# Altium integrated library TI Power Management Battery Management.IntLib: 950 symbols (part 5 of 48)
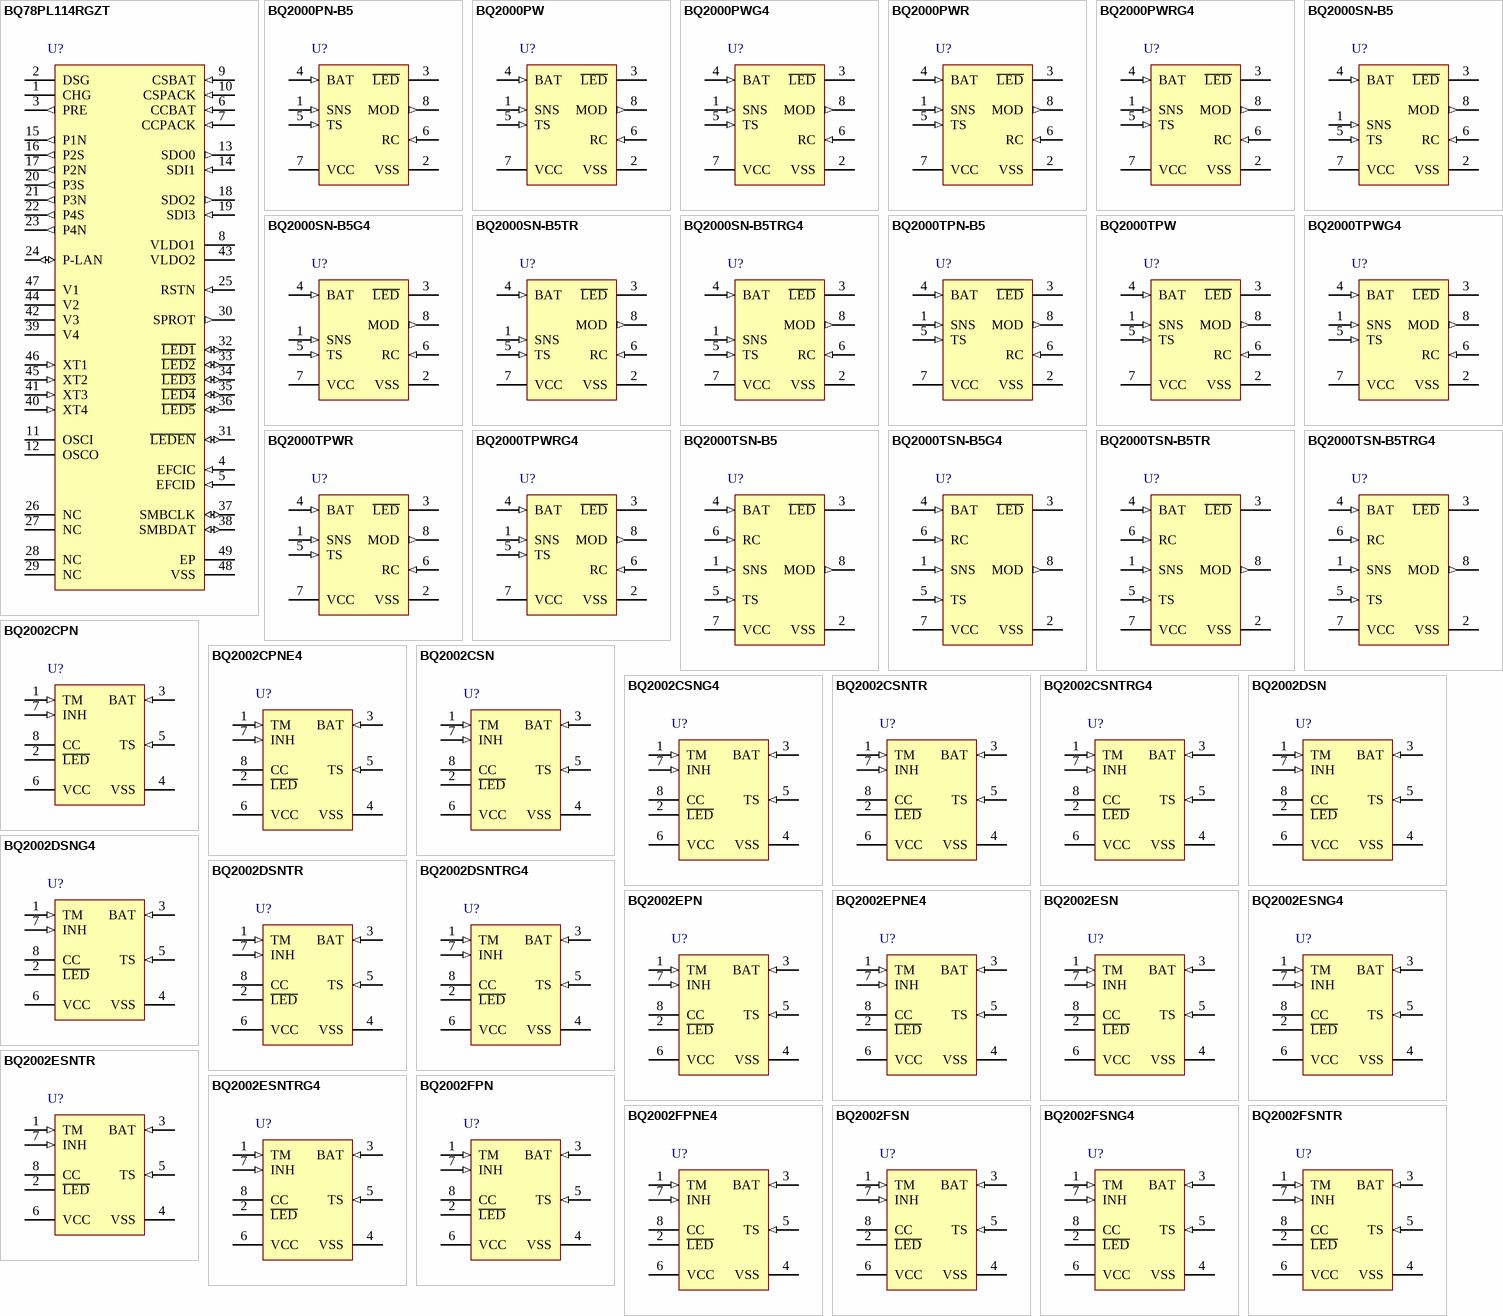
[diagram p38: symbols BQ78PL114RGZT to BQ2002FSNTR]

## BQ2000PWRG4
designator U?
Switch-Mode Multi-Chemistry Battery Charger with Peak Voltage Detection Termination, 4 V, -20 to 70 degC, 8-pin TSSOP (PW), Green (RoHS & no Sb/Br); PartNumber: BQ2000PWRG4; Manufacturer: Texas Instruments; Lead Acid: N; Li-Ion: Y; SubFamily: Battery Charge Management; Vin(Min)(V): 4; DatasheetVersion: SLUS138D; PackageVersion: revG, Feb-2011; PackageReference: PW8; PackageDescription: 8-Pin Plastic Thin Small Outline Package 3 x 4.4 mm Body ,0.65 mm Pitch; Supplier 1: Digi-Key; Supplier Part Number 1: BQ2000PWRG4-ND; Supplier Part Number 3: 595-BQ2000PWRG4; Eco-Plan: Green (RoHS & no Sb/Br); Li-Polymer: Y; NiCd: Y; NiMH: Y; Over Voltage Protection: N; Mounting Technology: Surface Mount; Code_JEDEC: MO-153; ComponentLink1Description: Datasheet; ComponentLink1URL: http://www.ti.com/general/docs/lit/getliterature.tsp?genericPartNumber=BQ2000&fileType=pdf
footprint PW8_N (TSOP, 8-Leads, Body 3x4.4mm, Pitch 0.65mm, IPC Medium Density)
footprint PW8_L (TSOP, 8-Leads, Body 3x4.4mm, Pitch 0.65mm, IPC High Density)
footprint PW8_M (TSOP, 8-Leads, Body 3x4.4mm, Pitch 0.65mm, IPC Low Density)
pins: 1 SNS (in) "Current-sense input. Enables the bq2000 to sense the battery current via the voltage developed on this pin by an external sense-resistor connected in series with the battery pack", 2 VSS (power) "System ground. Connect to the battery’s negative terminal", 3 ~{LED} (hiz) "Charge-status output. Open-drain output that indicates the charging status by turning on, turning off, or flashing an external LED, driven through a resistor.", 4 BAT (in) "Battery-voltage input. Battery-voltage sense input. A simple resistive divider, across the battery terminals, generates this input.", 5 TS (in) "Temperature-sense input. Input for an external battery-temperature monitoring circuit. An external resistive divider network with a negative temperature-coefficient thermistor sets the lower and upper temperature thresholds.", 6 RC (in) "Timer-program input. Used to program the maximum fast charge-time, maximum top-off charge-time, hold-off period, trickle charge rate, and to disable or enable top-off charge. A capacitor from VCC and a resistor to ground (See Datasheet)", 7 VCC (power) "Supply-voltage input. Recommended bypassing is 10 uF + 0.1 uF to 0.22 uF of decoupling capacitance near the pin.", 8 MOD (out) "Modulation-control output. Push-pull output that controls the charging current to the battery. MOD switches high to enable charging current to flow and low to inhibit charging-current flow."

## BQ2000SN-B5
designator U?
Switch-Mode Multi-Chemistry Battery Charger with Peak Voltage Detection Termination, 4 V, -20 to 70 degC, 8-pin SOIC (D), Green (RoHS & no Sb/Br); PartNumber: BQ2000SN-B5; Manufacturer: Texas Instruments; Lead Acid: N; Li-Ion: Y; SubFamily: Battery Charge Management; Vin(Min)(V): 4; DatasheetVersion: SLUS138D; PackageVersion: revM, Jun-2011; PackageReference: D8; PackageDescription: 8-Pin Plastic Small Outline Integrated Circuit, 4.9 x 3.9 mm, Pitch 1.27 mm Pitch; Supplier 1: Digi-Key; Supplier Part Number 1: 296-9314-5-ND; Supplier Part Number 3: 06M5840; Eco-Plan: Green (RoHS & no Sb/Br); Li-Polymer: Y; NiCd: Y; NiMH: Y; Over Voltage Protection: N; Mounting Technology: Surface Mount; Code_JEDEC: MS-012AA; ComponentLink1Description: Datasheet; ComponentLink1URL: http://www.ti.com/general/docs/lit/getliterature.tsp?genericPartNumber=BQ2000&fileType=pdf
footprint D8_N (SOIC, 8-Leads, Body 4.9x3.9mm, Pitch 1.27mm, IPC Medium Density)
footprint D8_L (SOIC, 8-Leads, Body 4.9x3.9mm, Pitch 1.27mm, IPC High Density)
footprint D8_M (SOIC, 8-Leads, Body 4.9x3.9mm, Pitch 1.27mm, IPC Low Density)
pins: 1 SNS (in) "Current-sense input. Enables the bq2000 to sense the battery current via the voltage developed on this pin by an external sense-resistor connected in series with the battery pack", 2 VSS (power) "System ground. Connect to the battery's negative terminal", 3 ~{LED} (hiz) "Charge-status output. Open-drain output that indicates the charging status by turning on, turning off, or flashing an external LED, driven through a resistor.", 4 BAT (in) "Battery-voltage input. Battery-voltage sense input. A simple resistive divider, across the battery terminals, generates this input.", 5 TS (in) "Temperature-sense input. Input for an external battery-temperature monitoring circuit. An external resistive divider network with a negative temperature-coefficient thermistor sets the lower and upper temperature thresholds.", 6 RC (in) "Timer-program input. Used to program the maximum fast charge-time, maximum top-off charge-time, hold-off period, trickle charge rate, and to disable or enable top-off charge. A capacitor from VCC and a resistor to ground (See Datasheet)", 7 VCC (power) "Supply-voltage input. Recommended bypassing is 10 uF + 0.1 uF to 0.22 uF of decoupling capacitance near the pin.", 8 MOD (out) "Modulation-control output. Push-pull output that controls the charging current to the battery. MOD switches high to enable charging current to flow and low to inhibit charging-current flow."

## BQ2000SN-B5G4
designator U?
Switch-Mode Multi-Chemistry Battery Charger with Peak Voltage Detection Termination, 4 V, -20 to 70 degC, 8-pin SOIC (D), Green (RoHS & no Sb/Br); PartNumber: BQ2000SN-B5G4; Manufacturer: Texas Instruments; Lead Acid: N; Li-Ion: Y; SubFamily: Battery Charge Management; Vin(Min)(V): 4; DatasheetVersion: SLUS138D; PackageVersion: revM, Jun-2011; PackageReference: D8; PackageDescription: 8-Pin Plastic Small Outline Integrated Circuit, 4.9 x 3.9 mm, Pitch 1.27 mm Pitch; Supplier 1: Digi-Key; Supplier Part Number 1: BQ2000SN-B5G4-ND; Supplier Part Number 3: 595-BQ2000SN-B5G4; Eco-Plan: Green (RoHS & no Sb/Br); Li-Polymer: Y; NiCd: Y; NiMH: Y; Over Voltage Protection: N; Mounting Technology: Surface Mount; Code_JEDEC: MS-012AA; ComponentLink1Description: Datasheet; ComponentLink1URL: http://www.ti.com/general/docs/lit/getliterature.tsp?genericPartNumber=BQ2000&fileType=pdf
footprint D8_N (SOIC, 8-Leads, Body 4.9x3.9mm, Pitch 1.27mm, IPC Medium Density)
footprint D8_L (SOIC, 8-Leads, Body 4.9x3.9mm, Pitch 1.27mm, IPC High Density)
footprint D8_M (SOIC, 8-Leads, Body 4.9x3.9mm, Pitch 1.27mm, IPC Low Density)
pins: 1 SNS (in) "Current-sense input. Enables the bq2000 to sense the battery current via the voltage developed on this pin by an external sense-resistor connected in series with the battery pack", 2 VSS (power) "System ground. Connect to the battery's negative terminal", 3 ~{LED} (hiz) "Charge-status output. Open-drain output that indicates the charging status by turning on, turning off, or flashing an external LED, driven through a resistor.", 4 BAT (in) "Battery-voltage input. Battery-voltage sense input. A simple resistive divider, across the battery terminals, generates this input.", 5 TS (in) "Temperature-sense input. Input for an external battery-temperature monitoring circuit. An external resistive divider network with a negative temperature-coefficient thermistor sets the lower and upper temperature thresholds.", 6 RC (in) "Timer-program input. Used to program the maximum fast charge-time, maximum top-off charge-time, hold-off period, trickle charge rate, and to disable or enable top-off charge. A capacitor from VCC and a resistor to ground (See Datasheet)", 7 VCC (power) "Supply-voltage input. Recommended bypassing is 10 uF + 0.1 uF to 0.22 uF of decoupling capacitance near the pin.", 8 MOD (out) "Modulation-control output. Push-pull output that controls the charging current to the battery. MOD switches high to enable charging current to flow and low to inhibit charging-current flow."

## BQ2000SN-B5TR
designator U?
Switch-Mode Multi-Chemistry Battery Charger with Peak Voltage Detection Termination, 4 V, -20 to 70 degC, 8-pin SOIC (D), Green (RoHS & no Sb/Br); PartNumber: BQ2000SN-B5TR; Manufacturer: Texas Instruments; Lead Acid: N; Li-Ion: Y; SubFamily: Battery Charge Management; Vin(Min)(V): 4; DatasheetVersion: SLUS138D; PackageVersion: revM, Jun-2011; PackageReference: D8; PackageDescription: 8-Pin Plastic Small Outline Integrated Circuit, 4.9 x 3.9 mm, Pitch 1.27 mm Pitch; Supplier 1: Digi-Key; Supplier Part Number 1: 296-25915-2-ND; Supplier Part Number 3: 296-25915-6-ND; Eco-Plan: Green (RoHS & no Sb/Br); Li-Polymer: Y; NiCd: Y; NiMH: Y; Over Voltage Protection: N; Mounting Technology: Surface Mount; Code_JEDEC: MS-012AA; ComponentLink1Description: Datasheet; ComponentLink1URL: http://www.ti.com/general/docs/lit/getliterature.tsp?genericPartNumber=BQ2000&fileType=pdf
footprint D8_N (SOIC, 8-Leads, Body 4.9x3.9mm, Pitch 1.27mm, IPC Medium Density)
footprint D8_L (SOIC, 8-Leads, Body 4.9x3.9mm, Pitch 1.27mm, IPC High Density)
footprint D8_M (SOIC, 8-Leads, Body 4.9x3.9mm, Pitch 1.27mm, IPC Low Density)
pins: 1 SNS (in) "Current-sense input. Enables the bq2000 to sense the battery current via the voltage developed on this pin by an external sense-resistor connected in series with the battery pack", 2 VSS (power) "System ground. Connect to the battery's negative terminal", 3 ~{LED} (hiz) "Charge-status output. Open-drain output that indicates the charging status by turning on, turning off, or flashing an external LED, driven through a resistor.", 4 BAT (in) "Battery-voltage input. Battery-voltage sense input. A simple resistive divider, across the battery terminals, generates this input.", 5 TS (in) "Temperature-sense input. Input for an external battery-temperature monitoring circuit. An external resistive divider network with a negative temperature-coefficient thermistor sets the lower and upper temperature thresholds.", 6 RC (in) "Timer-program input. Used to program the maximum fast charge-time, maximum top-off charge-time, hold-off period, trickle charge rate, and to disable or enable top-off charge. A capacitor from VCC and a resistor to ground (See Datasheet)", 7 VCC (power) "Supply-voltage input. Recommended bypassing is 10 uF + 0.1 uF to 0.22 uF of decoupling capacitance near the pin.", 8 MOD (out) "Modulation-control output. Push-pull output that controls the charging current to the battery. MOD switches high to enable charging current to flow and low to inhibit charging-current flow."

## BQ2000SN-B5TRG4
designator U?
Switch-Mode Multi-Chemistry Battery Charger with Peak Voltage Detection Termination, 4 V, -20 to 70 degC, 8-pin SOIC (D), Green (RoHS & no Sb/Br); PartNumber: BQ2000SN-B5TRG4; Manufacturer: Texas Instruments; Lead Acid: N; Li-Ion: Y; SubFamily: Battery Charge Management; Vin(Min)(V): 4; DatasheetVersion: SLUS138D; PackageVersion: revM, Jun-2011; PackageReference: D8; PackageDescription: 8-Pin Plastic Small Outline Integrated Circuit, 4.9 x 3.9 mm, Pitch 1.27 mm Pitch; Supplier 1: Digi-Key; Supplier Part Number 1: BQ2000SN-B5TRG4-ND; Supplier Part Number 3: 595-BQ2000SN-B5TRG4; Eco-Plan: Green (RoHS & no Sb/Br); Li-Polymer: Y; NiCd: Y; NiMH: Y; Over Voltage Protection: N; Mounting Technology: Surface Mount; Code_JEDEC: MS-012AA; ComponentLink1Description: Datasheet; ComponentLink1URL: http://www.ti.com/general/docs/lit/getliterature.tsp?genericPartNumber=BQ2000&fileType=pdf
footprint D8_N (SOIC, 8-Leads, Body 4.9x3.9mm, Pitch 1.27mm, IPC Medium Density)
footprint D8_L (SOIC, 8-Leads, Body 4.9x3.9mm, Pitch 1.27mm, IPC High Density)
footprint D8_M (SOIC, 8-Leads, Body 4.9x3.9mm, Pitch 1.27mm, IPC Low Density)
pins: 1 SNS (in) "Current-sense input. Enables the bq2000 to sense the battery current via the voltage developed on this pin by an external sense-resistor connected in series with the battery pack", 2 VSS (power) "System ground. Connect to the battery's negative terminal", 3 ~{LED} (hiz) "Charge-status output. Open-drain output that indicates the charging status by turning on, turning off, or flashing an external LED, driven through a resistor.", 4 BAT (in) "Battery-voltage input. Battery-voltage sense input. A simple resistive divider, across the battery terminals, generates this input.", 5 TS (in) "Temperature-sense input. Input for an external battery-temperature monitoring circuit. An external resistive divider network with a negative temperature-coefficient thermistor sets the lower and upper temperature thresholds.", 6 RC (in) "Timer-program input. Used to program the maximum fast charge-time, maximum top-off charge-time, hold-off period, trickle charge rate, and to disable or enable top-off charge. A capacitor from VCC and a resistor to ground (See Datasheet)", 7 VCC (power) "Supply-voltage input. Recommended bypassing is 10 uF + 0.1 uF to 0.22 uF of decoupling capacitance near the pin.", 8 MOD (out) "Modulation-control output. Push-pull output that controls the charging current to the battery. MOD switches high to enable charging current to flow and low to inhibit charging-current flow."

## BQ2000TPN-B5
designator U?
Switch-Mode Multi-Chemistry Battery Charger with dT / dt Termination, 4 V, -20 to 70 degC, 8-pin PDIP (P), Pb-Free (RoHS); PartNumber: BQ2000TPN-B5; Manufacturer: Texas Instruments; Lead Acid: N; Li-Ion: Y; SubFamily: Battery Charge Management; Vin(Min)(V): 4; DatasheetVersion: SLUS149D; PackageVersion: revE, Apr-2010; PackageReference: P8; PackageDescription: 8-Pin Plastic Dual-In-Line Package, Row Spacing 7.62 mm, Pitch 2.54 mm; Supplier 1: Digi-Key; Supplier Part Number 1: 296-9315-5-ND; Supplier Part Number 3: 595-BQ2000TPN-B5; Eco-Plan: Pb-Free (RoHS); Li-Polymer: Y; NiCd: Y; NiMH: Y; Over Voltage Protection: N; Mounting Technology: Through Hole; Code_JEDEC: MS-001-BA; ComponentLink1Description: Datasheet; ComponentLink1URL: http://www.ti.com/general/docs/lit/getliterature.tsp?genericPartNumber=BQ2000T&fileType=pdf
footprint P8 (DIP, 8-Leads, Row Spacing 7.62mm, Pitch 2.54mm, Body 9.6x6.4mm)
pins: 1 SNS (in) "Current-sense input. Enables the bq2000T to sense the battery current via the voltage developed on this pin by an external sense-resistor connected in series with the battery pack", 2 VSS (power) "System ground. Connect to the battery’s negative terminal", 3 ~{LED} (hiz) "Charge-status output. Open-drain output that indicates the charging status by turning on, turning off, or flashing an external LED, driven through a resistor.", 4 BAT (in) "Battery-voltage input. Battery-voltage sense input. A simple resistive divider, across the battery terminals, generates this input.", 5 TS (in) "Temperature-sense input. Input for an external battery-temperature monitoring circuit. An external resistive divider network with a negative temperature-coefficient thermistor sets the lower and upper temperature thresholds.", 6 RC (in) "Timer-program input. Used to program the maximum fast charge-time, maximum top-off charge-time, hold-off period, trickle charge rate, and to disable or enable top-off charge. A capacitor from VCC and a resistor to ground (See Datasheet)", 7 VCC (power) "Supply-voltage input. Recommended bypassing is 10 uF + 0.1 uF to 0.22 uF of decoupling capacitance near the pin.", 8 MOD (out) "Modulation-control output. Push-pull output that controls the charging current to the battery. MOD switches high to enable charging current to flow and low to inhibit charging-current flow."

## BQ2000TPW
designator U?
Switch-Mode Multi-Chemistry Battery Charger with dT / dt Termination, 4 V, -20 to 70 degC, 8-pin TSSOP (PW), Green (RoHS & no Sb/Br); PartNumber: BQ2000TPW; Manufacturer: Texas Instruments; Lead Acid: N; Li-Ion: Y; SubFamily: Battery Charge Management; Vin(Min)(V): 4; DatasheetVersion: SLUS149D; PackageVersion: revG, Feb-2011; PackageReference: PW8; PackageDescription: 8-Pin Plastic Thin Small Outline Package 3 x 4.4 mm Body ,0.65 mm Pitch; Supplier 1: Digi-Key; Supplier Part Number 1: 296-12360-5-ND; Supplier Part Number 3: 595-BQ2000TPW; Eco-Plan: Green (RoHS & no Sb/Br); Li-Polymer: Y; NiCd: Y; NiMH: Y; Over Voltage Protection: N; Mounting Technology: Surface Mount; Code_JEDEC: MO-153; ComponentLink1Description: Datasheet; ComponentLink1URL: http://www.ti.com/general/docs/lit/getliterature.tsp?genericPartNumber=BQ2000T&fileType=pdf
footprint PW8_N (TSOP, 8-Leads, Body 3x4.4mm, Pitch 0.65mm, IPC Medium Density)
footprint PW8_L (TSOP, 8-Leads, Body 3x4.4mm, Pitch 0.65mm, IPC High Density)
footprint PW8_M (TSOP, 8-Leads, Body 3x4.4mm, Pitch 0.65mm, IPC Low Density)
pins: 1 SNS (in) "Current-sense input. Enables the bq2000T to sense the battery current via the voltage developed on this pin by an external sense-resistor connected in series with the battery pack", 2 VSS (power) "System ground. Connect to the battery¡¯s negative terminal", 3 ~{LED} (hiz) "Charge-status output. Open-drain output that indicates the charging status by turning on, turning off, or flashing an external LED, driven through a resistor.", 4 BAT (in) "Battery-voltage input. Battery-voltage sense input. A simple resistive divider, across the battery terminals, generates this input.", 5 TS (in) "Temperature-sense input. Input for an external battery-temperature monitoring circuit. An external resistive divider network with a negative temperature-coefficient thermistor sets the lower and upper temperature thresholds.", 6 RC (in) "Timer-program input. Used to program the maximum fast charge-time, maximum top-off charge-time, hold-off period, trickle charge rate, and to disable or enable top-off charge. A capacitor from VCC and a resistor to ground (See Datasheet)", 7 VCC (power) "Supply-voltage input. Recommended bypassing is 10 uF + 0.1 uF to 0.22 uF of decoupling capacitance near the pin.", 8 MOD (out) "Modulation-control output. Push-pull output that controls the charging current to the battery. MOD switches high to enable charging current to flow and low to inhibit charging-current flow."

## BQ2000TPWG4
designator U?
Switch-Mode Multi-Chemistry Battery Charger with dT / dt Termination, 4 V, -20 to 70 degC, 8-pin TSSOP (PW), Green (RoHS & no Sb/Br); PartNumber: BQ2000TPWG4; Manufacturer: Texas Instruments; Lead Acid: N; Li-Ion: Y; SubFamily: Battery Charge Management; Vin(Min)(V): 4; DatasheetVersion: SLUS149D; PackageVersion: revG, Feb-2011; PackageReference: PW8; PackageDescription: 8-Pin Plastic Thin Small Outline Package 3 x 4.4 mm Body ,0.65 mm Pitch; Supplier 1: Digi-Key; Supplier Part Number 1: BQ2000TPWG4-ND; Supplier Part Number 3: 595-BQ2000TPWG4; Eco-Plan: Green (RoHS & no Sb/Br); Li-Polymer: Y; NiCd: Y; NiMH: Y; Over Voltage Protection: N; Mounting Technology: Surface Mount; Code_JEDEC: MO-153; ComponentLink1Description: Datasheet; ComponentLink1URL: http://www.ti.com/general/docs/lit/getliterature.tsp?genericPartNumber=BQ2000T&fileType=pdf
footprint PW8_N (TSOP, 8-Leads, Body 3x4.4mm, Pitch 0.65mm, IPC Medium Density)
footprint PW8_L (TSOP, 8-Leads, Body 3x4.4mm, Pitch 0.65mm, IPC High Density)
footprint PW8_M (TSOP, 8-Leads, Body 3x4.4mm, Pitch 0.65mm, IPC Low Density)
pins: 1 SNS (in) "Current-sense input. Enables the bq2000T to sense the battery current via the voltage developed on this pin by an external sense-resistor connected in series with the battery pack", 2 VSS (power) "System ground. Connect to the battery¡¯s negative terminal", 3 ~{LED} (hiz) "Charge-status output. Open-drain output that indicates the charging status by turning on, turning off, or flashing an external LED, driven through a resistor.", 4 BAT (in) "Battery-voltage input. Battery-voltage sense input. A simple resistive divider, across the battery terminals, generates this input.", 5 TS (in) "Temperature-sense input. Input for an external battery-temperature monitoring circuit. An external resistive divider network with a negative temperature-coefficient thermistor sets the lower and upper temperature thresholds.", 6 RC (in) "Timer-program input. Used to program the maximum fast charge-time, maximum top-off charge-time, hold-off period, trickle charge rate, and to disable or enable top-off charge. A capacitor from VCC and a resistor to ground (See Datasheet)", 7 VCC (power) "Supply-voltage input. Recommended bypassing is 10 uF + 0.1 uF to 0.22 uF of decoupling capacitance near the pin.", 8 MOD (out) "Modulation-control output. Push-pull output that controls the charging current to the battery. MOD switches high to enable charging current to flow and low to inhibit charging-current flow."

## BQ2000TPWR
designator U?
Switch-Mode Multi-Chemistry Battery Charger with dT / dt Termination, 4 V, -20 to 70 degC, 8-pin TSSOP (PW), Green (RoHS & no Sb/Br); PartNumber: BQ2000TPWR; Manufacturer: Texas Instruments; Lead Acid: N; Li-Ion: Y; SubFamily: Battery Charge Management; Vin(Min)(V): 4; DatasheetVersion: SLUS149D; PackageVersion: revG, Feb-2011; PackageReference: PW8; PackageDescription: 8-Pin Plastic Thin Small Outline Package 3 x 4.4 mm Body ,0.65 mm Pitch; Supplier 1: Digi-Key; Supplier Part Number 1: BQ2000TPWR-ND; Supplier Part Number 3: 595-BQ2000TPWR; Eco-Plan: Green (RoHS & no Sb/Br); Li-Polymer: Y; NiCd: Y; NiMH: Y; Over Voltage Protection: N; Mounting Technology: Surface Mount; Code_JEDEC: MO-153; ComponentLink1Description: Datasheet; ComponentLink1URL: http://www.ti.com/general/docs/lit/getliterature.tsp?genericPartNumber=BQ2000T&fileType=pdf
footprint PW8_N (TSOP, 8-Leads, Body 3x4.4mm, Pitch 0.65mm, IPC Medium Density)
footprint PW8_L (TSOP, 8-Leads, Body 3x4.4mm, Pitch 0.65mm, IPC High Density)
footprint PW8_M (TSOP, 8-Leads, Body 3x4.4mm, Pitch 0.65mm, IPC Low Density)
pins: 1 SNS (in) "Current-sense input. Enables the bq2000T to sense the battery current via the voltage developed on this pin by an external sense-resistor connected in series with the battery pack", 2 VSS (power) "System ground. Connect to the battery¡¯s negative terminal", 3 ~{LED} (hiz) "Charge-status output. Open-drain output that indicates the charging status by turning on, turning off, or flashing an external LED, driven through a resistor.", 4 BAT (in) "Battery-voltage input. Battery-voltage sense input. A simple resistive divider, across the battery terminals, generates this input.", 5 TS (in) "Temperature-sense input. Input for an external battery-temperature monitoring circuit. An external resistive divider network with a negative temperature-coefficient thermistor sets the lower and upper temperature thresholds.", 6 RC (in) "Timer-program input. Used to program the maximum fast charge-time, maximum top-off charge-time, hold-off period, trickle charge rate, and to disable or enable top-off charge. A capacitor from VCC and a resistor to ground (See Datasheet)", 7 VCC (power) "Supply-voltage input. Recommended bypassing is 10 uF + 0.1 uF to 0.22 uF of decoupling capacitance near the pin.", 8 MOD (out) "Modulation-control output. Push-pull output that controls the charging current to the battery. MOD switches high to enable charging current to flow and low to inhibit charging-current flow."

## BQ2000TPWRG4
designator U?
Switch-Mode Multi-Chemistry Battery Charger with dT / dt Termination, 4 V, -20 to 70 degC, 8-pin TSSOP (PW), Green (RoHS & no Sb/Br); PartNumber: BQ2000TPWRG4; Manufacturer: Texas Instruments; Lead Acid: N; Li-Ion: Y; SubFamily: Battery Charge Management; Vin(Min)(V): 4; DatasheetVersion: SLUS149D; PackageVersion: revG, Feb-2011; PackageReference: PW8; PackageDescription: 8-Pin Plastic Thin Small Outline Package 3 x 4.4 mm Body ,0.65 mm Pitch; Supplier 1: Digi-Key; Supplier Part Number 1: BQ2000TPWRG4-ND; Supplier Part Number 3: 595-BQ2000TPWRG4; Eco-Plan: Green (RoHS & no Sb/Br); Li-Polymer: Y; NiCd: Y; NiMH: Y; Over Voltage Protection: N; Mounting Technology: Surface Mount; Code_JEDEC: MO-153; ComponentLink1Description: Datasheet; ComponentLink1URL: http://www.ti.com/general/docs/lit/getliterature.tsp?genericPartNumber=BQ2000T&fileType=pdf
footprint PW8_N (TSOP, 8-Leads, Body 3x4.4mm, Pitch 0.65mm, IPC Medium Density)
footprint PW8_L (TSOP, 8-Leads, Body 3x4.4mm, Pitch 0.65mm, IPC High Density)
footprint PW8_M (TSOP, 8-Leads, Body 3x4.4mm, Pitch 0.65mm, IPC Low Density)
pins: 1 SNS (in) "Current-sense input. Enables the bq2000T to sense the battery current via the voltage developed on this pin by an external sense-resistor connected in series with the battery pack", 2 VSS (power) "System ground. Connect to the battery¡¯s negative terminal", 3 ~{LED} (hiz) "Charge-status output. Open-drain output that indicates the charging status by turning on, turning off, or flashing an external LED, driven through a resistor.", 4 BAT (in) "Battery-voltage input. Battery-voltage sense input. A simple resistive divider, across the battery terminals, generates this input.", 5 TS (in) "Temperature-sense input. Input for an external battery-temperature monitoring circuit. An external resistive divider network with a negative temperature-coefficient thermistor sets the lower and upper temperature thresholds.", 6 RC (in) "Timer-program input. Used to program the maximum fast charge-time, maximum top-off charge-time, hold-off period, trickle charge rate, and to disable or enable top-off charge. A capacitor from VCC and a resistor to ground (See Datasheet)", 7 VCC (power) "Supply-voltage input. Recommended bypassing is 10 uF + 0.1 uF to 0.22 uF of decoupling capacitance near the pin.", 8 MOD (out) "Modulation-control output. Push-pull output that controls the charging current to the battery. MOD switches high to enable charging current to flow and low to inhibit charging-current flow."

## BQ2000TSN-B5
designator U?
Switch-Mode Multi-Chemistry Battery Charger with dT / dt Termination, 4 V, -20 to 70 degC, 8-pin SOIC (D), Green (RoHS & no Sb/Br); PartNumber: BQ2000TSN-B5; Manufacturer: Texas Instruments; Lead Acid: N; Li-Ion: Y; SubFamily: Battery Charge Management; Vin(Min)(V): 4; DatasheetVersion: SLUS149D; PackageVersion: revM, Jun-2011; PackageReference: D8; PackageDescription: 8-Pin Plastic Small Outline Integrated Circuit, 4.9 x 3.9 mm, Pitch 1.27 mm Pitch; Supplier 1: Digi-Key; Supplier Part Number 1: 296-9316-5-ND; Supplier Part Number 3: 74C7508; Eco-Plan: Green (RoHS & no Sb/Br); Li-Polymer: Y; NiCd: Y; NiMH: Y; Over Voltage Protection: N; Mounting Technology: Surface Mount; Code_JEDEC: MS-012AA; ComponentLink1Description: Datasheet; ComponentLink1URL: http://www.ti.com/general/docs/lit/getliterature.tsp?genericPartNumber=BQ2000T&fileType=pdf
footprint D8_N (SOIC, 8-Leads, Body 4.9x3.9mm, Pitch 1.27mm, IPC Medium Density)
footprint D8_L (SOIC, 8-Leads, Body 4.9x3.9mm, Pitch 1.27mm, IPC High Density)
footprint D8_M (SOIC, 8-Leads, Body 4.9x3.9mm, Pitch 1.27mm, IPC Low Density)
pins: 1 SNS (in) "Current-sense input.Enables the bq2000T to sense the battery current via the voltage developed on this pin by an external sense-resistor connected in series with the battery pack", 2 VSS (power) "System ground.Connect to the battery’s negative terminal", 3 ~{LED} (hiz) "Charge-status output.Open-drain output that indicates the charging status by turning on, turning off, or flashing an external", 4 BAT (in) "Battery-voltage input. Battery-voltage sense input. A simple resistive divider, across the battery terminals, generates this", 5 TS (in) "Temperature-sense input.Input for an external battery-temperature monitoring circuit. An external resistive divider network with a negative temperature-coefficient thermistor sets the lower and upper temperature thresholds.", 6 RC (in) "Timer-program input.Used to program the maximum fast charge-time, maximum top-off charge-time, hold-off period, trickle charge rate, and to disable or enable top-off charge. A capacitor from VCC and a resistor to ground (See Datasheet)", 7 VCC (power) "Supply-voltage input.Recommended bypassing is 10 µF + 0.1 µF to 0.22 µF of decoupling capacitance near the pin.", 8 MOD (out) "Modulation-control output.Push-pull output that controls the charging current to the battery. MOD switches high to enable charging current to flow and low to inhibit charging-current flow."

## BQ2000TSN-B5G4
designator U?
Switch-Mode Multi-Chemistry Battery Charger with dT / dt Termination, 4 V, -20 to 70 degC, 8-pin SOIC (D), Green (RoHS & no Sb/Br); PartNumber: BQ2000TSN-B5G4; Manufacturer: Texas Instruments; Lead Acid: N; Li-Ion: Y; SubFamily: Battery Charge Management; Vin(Min)(V): 4; DatasheetVersion: SLUS149D; PackageVersion: revM, Jun-2011; PackageReference: D8; PackageDescription: 8-Pin Plastic Small Outline Integrated Circuit, 4.9 x 3.9 mm, Pitch 1.27 mm Pitch; Supplier 1: Digi-Key; Supplier Part Number 1: BQ2000TSN-B5G4-ND; Supplier Part Number 3: 595-BQ2000TSN-B5G4; Eco-Plan: Green (RoHS & no Sb/Br); Li-Polymer: Y; NiCd: Y; NiMH: Y; Over Voltage Protection: N; Mounting Technology: Surface Mount; Code_JEDEC: MS-012AA; ComponentLink1Description: Datasheet; ComponentLink1URL: http://www.ti.com/general/docs/lit/getliterature.tsp?genericPartNumber=BQ2000T&fileType=pdf
footprint D8_N (SOIC, 8-Leads, Body 4.9x3.9mm, Pitch 1.27mm, IPC Medium Density)
footprint D8_L (SOIC, 8-Leads, Body 4.9x3.9mm, Pitch 1.27mm, IPC High Density)
footprint D8_M (SOIC, 8-Leads, Body 4.9x3.9mm, Pitch 1.27mm, IPC Low Density)
pins: 1 SNS (in) "Current-sense input.Enables the bq2000T to sense the battery current via the voltage developed on this pin by an external sense-resistor connected in series with the battery pack", 2 VSS (power) "System ground.Connect to the battery’s negative terminal", 3 ~{LED} (hiz) "Charge-status output.Open-drain output that indicates the charging status by turning on, turning off, or flashing an external", 4 BAT (in) "Battery-voltage input. Battery-voltage sense input. A simple resistive divider, across the battery terminals, generates this", 5 TS (in) "Temperature-sense input.Input for an external battery-temperature monitoring circuit. An external resistive divider network with a negative temperature-coefficient thermistor sets the lower and upper temperature thresholds.", 6 RC (in) "Timer-program input.Used to program the maximum fast charge-time, maximum top-off charge-time, hold-off period, trickle charge rate, and to disable or enable top-off charge. A capacitor from VCC and a resistor to ground (See Datasheet)", 7 VCC (power) "Supply-voltage input.Recommended bypassing is 10 µF + 0.1 µF to 0.22 µF of decoupling capacitance near the pin.", 8 MOD (out) "Modulation-control output.Push-pull output that controls the charging current to the battery. MOD switches high to enable charging current to flow and low to inhibit charging-current flow."
